# Altium integrated library EwgMicrochips.IntLib: 118 symbols (part 1 of 2) (continued)
## LPC2129 (continued)
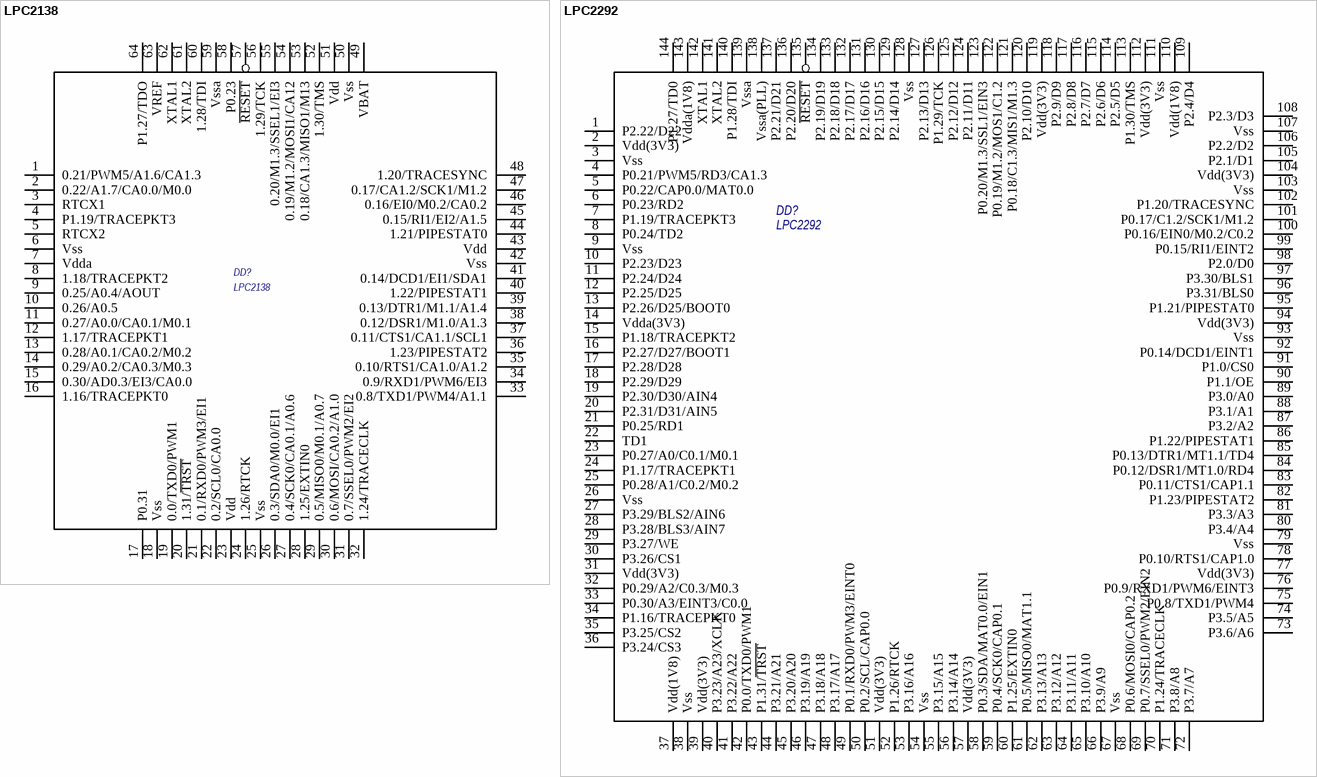
[diagram p3: symbols LPC2138 to LPC2292]

## LPC2138
designator DD?
Микроконтроллер; Примечание: NXP; Тип корпуса: LQFP64; Тип монтажа: Поверхностный; Value: *; Наименование: LPC2138; Тип компонента: Микроконтроллер
footprint LQFP64
pins: 1 0.21/PWM5/A1.6/CA1.3, 2 0.22/A1.7/CA0.0/M0.0, 3 RTCX1, 4 P1.19/TRACEPKT3, 5 RTCX2, 6 Vss, 7 Vdda, 8 1.18/TRACEPKT2, 9 0.25/A0.4/AOUT, 10 0.26/A0.5, 11 0.27/A0.0/CA0.1/M0.1, 12 1.17/TRACEPKT1, 13 0.28/A0.1/CA0.2/M0.2, 14 0.29/A0.2/CA0.3/M0.3, 15 0.30/AD0.3/EI3/CA0.0, 16 1.16/TRACEPKT0, 17 P0.31, 18 Vss, 19 0.0/TXD0/PWM1, 20 1.31/~{TRST}, 21 0.1/RXD0/PWM3/EI1, 22 0.2/SCL0/CA0.0, 23 Vdd, 24 1.26/RTCK, 25 Vss, 26 0.3/SDA0/M0.0/EI1, 27 0.4/SCK0/CA0.1/A0.6, 28 1.25/EXTIN0, 29 0.5/MISO0/M0.1/A0.7, 30 0.6/MOSI/CA0.2/A1.0, 31 0.7/SSEL0/PWM2/EI2, 32 1.24/TRACECLK, 33 0.8/TXD1/PWM4/A1.1, 34 0.9/RXD1/PWM6/EI3, 35 0.10/RTS1/CA1.0/A1.2, 36 1.23/PIPESTAT2, 37 0.11/CTS1/CA1.1/SCL1, 38 0.12/DSR1/M1.0/A1.3, 39 0.13/DTR1/M1.1/A1.4, 40 1.22/PIPESTAT1, 41 0.14/DCD1/EI1/SDA1, 42 Vss, 43 Vdd, 44 1.21/PIPESTAT0, 45 0.15/RI1/EI2/A1.5, 46 0.16/EI0/M0.2/CA0.2, 47 0.17/CA1.2/SCK1/M1.2, 48 1.20/TRACESYNC, 49 VBAT, 50 Vss, 51 Vdd, 52 1.30/TMS, 53 0.18/CA1.3/MISO1/M13, 54 0.19/M1.2/MOSI1/CA12, 55 0.20/M1.3/SSEL1/EI3, 56 1.29/TCK, 57 ~{RESET}, 58 P0.23, 59 Vssa, 60 1.28/TDI, 61 XTAL2, 62 XTAL1, 63 VREF, 64 P1.27/TDO

## LPC2292
designator DD?
Микроконтроллер; Наименование: NXP, LPC2292FBD144; Тип корпуса: LQFP144; Тип монтажа: Поверхностный; Value: *; Тип компонента: Микроконтроллер
footprint LQFP144
pins: 1 P2.22/D22, 2 Vdd(3V3), 3 Vss, 4 P0.21/PWM5/RD3/CA1.3, 5 P0.22/CAP0.0/MAT0.0, 6 P0.23/RD2, 7 P1.19/TRACEPKT3, 8 P0.24/TD2, 9 Vss, 10 P2.23/D23, 11 P2.24/D24, 12 P2.25/D25, 13 P2.26/D25/BOOT0, 14 Vdda(3V3), 15 P1.18/TRACEPKT2, 16 P2.27/D27/BOOT1, 17 P2.28/D28, 18 P2.29/D29, 19 P2.30/D30/AIN4, 20 P2.31/D31/AIN5, 21 P0.25/RD1, 22 TD1, 23 P0.27/A0/C0.1/M0.1, 24 P1.17/TRACEPKT1, 25 P0.28/A1/C0.2/M0.2, 26 Vss, 27 P3.29/BLS2/AIN6, 28 P3.28/BLS3/AIN7, 29 P3.27/WE, 30 P3.26/CS1, 31 Vdd(3V3), 32 P0.29/A2/C0.3/M0.3, 33 P0.30/A3/EINT3/C0.0, 34 P1.16/TRACEPKT0, 35 P3.25/CS2, 36 P3.24/CS3, 37 Vdd(1V8), 38 Vss, 39 Vdd(3V3), 40 P3.23/A23/XCLK, 41 P3.22/A22, 42 P0.0/TXD0/PWM1, 43 P1.31/~{TRST}, 44 P3.21/A21, 45 P3.20/A20, 46 P3.19/A19, 47 P3.18/A18, 48 P3.17/A17, 49 P0.1/RXD0/PWM3/EINT0, 50 P0.2/SCL/CAP0.0, 51 Vdd(3V3), 52 P1.26/RTCK, 53 P3.16/A16, 54 Vss, 55 P3.15/A15, 56 P3.14/A14, 57 Vdd(3V3), 58 P0.3/SDA/MAT0.0/EIN1, 59 P0.4/SCK0/CAP0.1, 60 P1.25/EXTIN0, 61 P0.5/MISO0/MAT1.1, 62 P3.13/A13, 63 P3.12/A12, 64 P3.11/A11, 65 P3.10/A10, 66 P3.9/A9, 67 Vss, 68 P0.6/MOSI0/CAP0.2, 69 P0.7/SSEL0/PWM2/EIN2, 70 P1.24/TRACECLK, 71 P3.8/A8, 72 P3.7/A7, 73 P3.6/A6, 74 P3.5/A5, 75 P0.8/TXD1/PWM4, 76 P0.9/RXD1/PWM6/EINT3, 77 Vdd(3V3), 78 P0.10/RTS1/CAP1.0, 79 Vss, 80 P3.4/A4, 81 P3.3/A3, 82 P1.23/PIPESTAT2, 83 P0.11/CTS1/CAP1.1, 84 P0.12/DSR1/MT1.0/RD4, 85 P0.13/DTR1/MT1.1/TD4, 86 P1.22/PIPESTAT1, 87 P3.2/A2, 88 P3.1/A1, 89 P3.0/A0, 90 P1.1/OE, 91 P1.0/CS0, 92 P0.14/DCD1/EINT1, 93 Vss, 94 Vdd(3V3), 95 P1.21/PIPESTAT0, 96 P3.31/BLS0, 97 P3.30/BLS1, 98 P2.0/D0, 99 P0.15/RI1/EINT2, 100 P0.16/EIN0/M0.2/C0.2, 101 P0.17/C1.2/SCK1/M1.2, 102 P1.20/TRACESYNC, 103 Vss, 104 Vdd(3V3), 105 P2.1/D1, 106 P2.2/D2, 107 Vss, 108 P2.3/D3, 109 P2.4/D4, 110 Vdd(1V8), 111 Vss, 112 Vdd(3V3), 113 P1.30/TMS, 114 P2.5/D5, 115 P2.6/D6, 116 P2.7/D7, 117 P2.8/D8, 118 P2.9/D9, 119 Vdd(3V3), 120 P2.10/D10, 121 P0.18/C1.3/MIS1/M1.3, 122 P0.19/M1.2/MOS1/C1.2, 123 P0.20/M1.3/SSL1/EIN3, 124 P2.11/D11, 125 P2.12/D12, 126 P1.29/TCK, 127 P2.13/D13, 128 Vss, 129 P2.14/D14, 130 P2.15/D15, 131 P2.16/D16, 132 P2.17/D17, 133 P2.18/D18, 134 P2.19/D19, 135 ~{RESET}, 136 P2.20/D20, 137 P2.21/D21, 138 Vssa(PLL), 139 Vssa, 140 P1.28/TDI, 141 XTAL2, 142 XTAL1, 143 Vdda(1V8), 144 P1.27/TD0

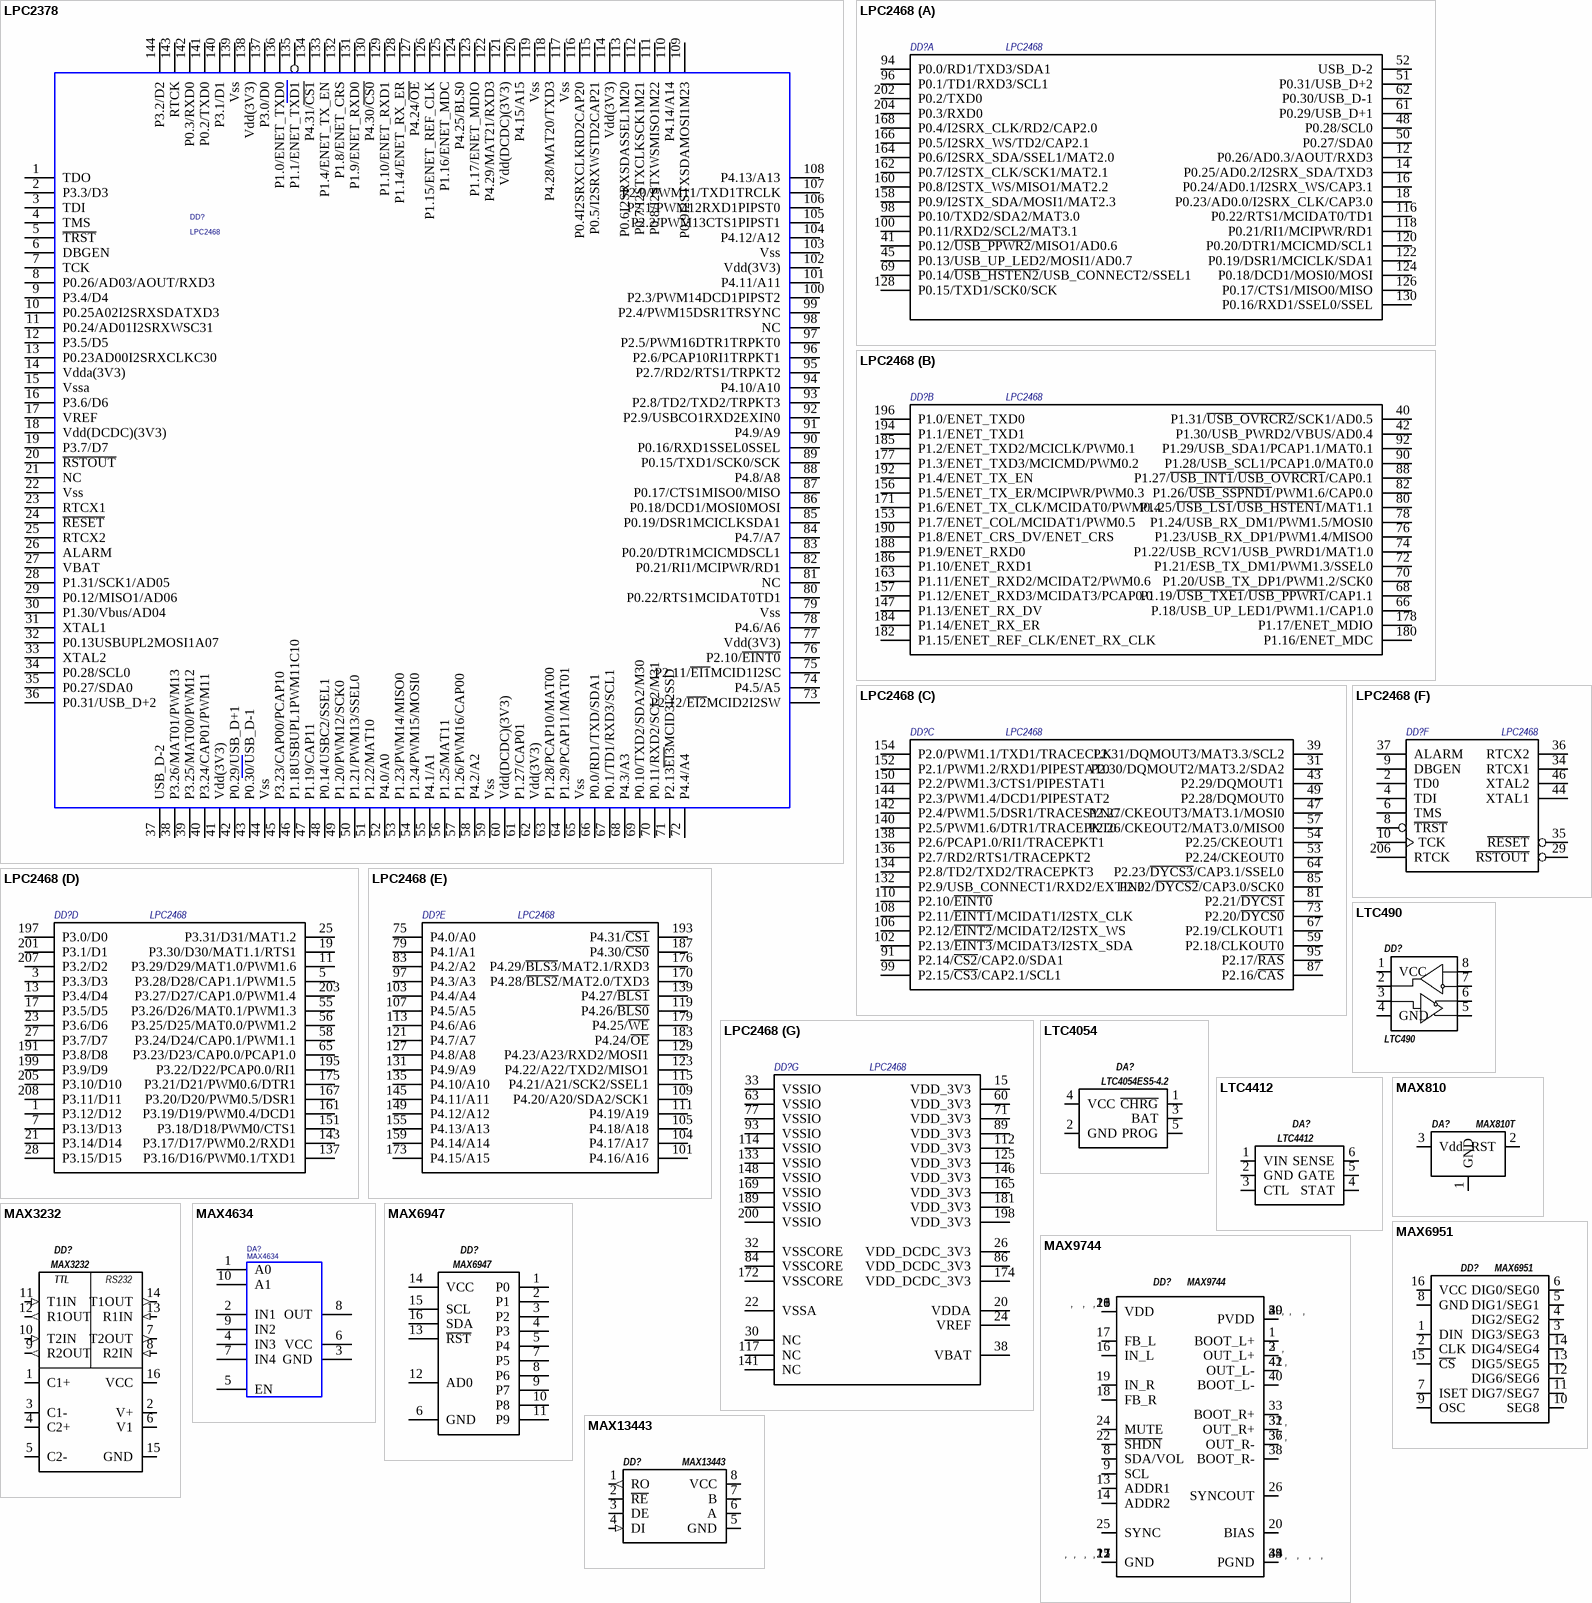
[diagram p4: symbols LPC2378 to MAX13443]

## LPC2378
designator DD?, comment LPC2468
Микроконтроллер; Наименование: NXP, LPC2378FBD144; Тип корпуса: LQFP144; Тип монтажа: Поверхностный; Value: *; Тип компонента: Микроконтроллер
footprint LQFP144
pins: 1 TDO, 2 P3.3/D3, 3 TDI, 4 TMS, 5 ~{TRST}, 6 DBGEN, 7 TCK, 8 P0.26/AD03/AOUT/RXD3, 9 P3.4/D4, 10 P0.25A02I2SRXSDATXD3, 11 P0.24/AD01I2SRXWSC31, 12 P3.5/D5, 13 P0.23AD00I2SRXCLKC30, 14 Vdda(3V3), 15 Vssa, 16 P3.6/D6, 17 VREF, 18 Vdd(DCDC)(3V3), 19 P3.7/D7, 20 ~{RSTOUT}, 21 NC, 22 Vss, 23 RTCX1, 24 ~{RESET}, 25 RTCX2, 26 ALARM, 27 VBAT, 28 P1.31/SCK1/AD05, 29 P0.12/MISO1/AD06, 30 P1.30/Vbus/AD04, 31 XTAL1, 32 P0.13USBUPL2MOSI1A07, 33 XTAL2, 34 P0.28/SCL0, 35 P0.27/SDA0, 36 P0.31/USB_D+2, 37 USB_D-2, 38 P3.26/MAT01/PWM13, 39 P3.25/MAT00/PWM12, 40 P3.24/CAP01/PWM11, 41 Vdd(3V3), 42 P0.29/USB_D+1, 43 P0.30/USB_D-1, 44 Vss, 45 P3.23/CAP00/PCAP10, 46 P1.18USBUPL1PWM11C10, 47 P1.19/CAP11, 48 P0.14/USBC2/SSEL1, 49 P1.20/PWM12/SCK0, 50 P1.21/PWM13/SSEL0, 51 P1.22/MAT10, 52 P4.0/A0, 53 P1.23/PWM14/MISO0, 54 P1.24/PWM15/MOSI0, 55 P4.1/A1, 56 P1.25/MAT11, 57 P1.26/PWM16/CAP00, 58 P4.2/A2, 59 Vss, 60 Vdd(DCDC)(3V3), 61 P1.27/CAP01, 62 Vdd(3V3), 63 P1.28/PCAP10/MAT00, 64 P1.29/PCAP11/MAT01, 65 Vss, 66 P0.0/RD1/TXD/SDA1, 67 P0.1/TD1/RXD3/SCL1, 68 P4.3/A3, 69 P0.10/TXD2/SDA2/M30, 70 P0.11/RXD2/SCL2/M31, 71 P2.13~{EI3}MCID3I2SSD, 72 P4.4/A4, 73 P2.12/~{EI2}MCID2I2SW, 74 P4.5/A5, 75 P2.11/~{EI1}MCID1I2SC, 76 P2.10/~{EINT0}, 77 Vdd(3V3), 78 P4.6/A6, 79 Vss, 80 P0.22/RTS1MCIDAT0TD1, 81 NC, 82 P0.21/RI1/MCIPWR/RD1, 83 P0.20/DTR1MCICMDSCL1, 84 P4.7/A7, 85 P0.19/DSR1MCICLKSDA1, 86 P0.18/DCD1/MOSI0MOSI, 87 P0.17/CTS1MISO0/MISO, 88 P4.8/A8, 89 P0.15/TXD1/SCK0/SCK, 90 P0.16/RXD1SSEL0SSEL, 91 P4.9/A9, 92 P2.9/USBCO1RXD2EXIN0, 93 P2.8/TD2/TXD2/TRPKT3, 94 P4.10/A10, 95 P2.7/RD2/RTS1/TRPKT2, 96 P2.6/PCAP10RI1TRPKT1, 97 P2.5/PWM16DTR1TRPKT0, 98 NC, 99 P2.4/PWM15DSR1TRSYNC, 100 P2.3/PWM14DCD1PIPST2, 101 P4.11/A11, 102 Vdd(3V3), 103 Vss, 104 P4.12/A12, 105 P2.2/PWM13CTS1PIPST1, 106 P2.1/PWM12RXD1PIPST0, 107 P2.0/PWM11/TXD1TRCLK, 108 P4.13/A13, 109 P0.9I2STXSDAMOSI1M23, 110 P4.14/A14, 111 P0.8/I2STXWSMISO1M22, 112 P0.7/I2STXCLKSCK1M21, 113 P0.6I2SRXSDASSEL1M20, 114 Vdd(3V3), 115 P0.5/I2SRXWSTD2CAP21, 116 P0.4I2SRXCLKRD2CAP20, 117 Vss, 118 P4.28/MAT20/TXD3, 119 Vss, 120 P4.15/A15, 121 Vdd(DCDC)(3V3), 122 P4.29/MAT21/RXD3, 123 P1.17/ENET_MDIO, 124 P4.25/BLS0, 125 P1.16/ENET_MDC, 126 P1.15/ENET_REF_CLK, 127 P4.24/~{OE}, 128 P1.14/ENET_RX_ER, 129 P1.10/ENET_RXD1, 130 P4.30/~{CS0}, 131 P1.9/ENET_RXD0, 132 P1.8/ENET_CRS, 133 P1.4/ENET_TX_EN, 134 P4.31/~{CS1}, 135 P1.1/ENET_TXD1, 136 P1.0/ENET_TXD0, 137 P3.0/D0, 138 Vdd(3V3), 139 Vss, 140 P3.1/D1, 141 P0.2/TXD0, 142 P0.3/RXD0, 143 RTCK, 144 P3.2/D2

## LPC2468
designator DD?
Микроконтроллер; Наименование: NXP, LPC2468FBD208; Тип корпуса: LQFP208; Тип монтажа: Поверхностный; Value: LPC2468; Тип компонента: Микроконтроллер
footprint LQFP208
part A pins: 12 P0.26/AD0.3/AOUT/RXD3, 14 P0.25/AD0.2/I2SRX_SDA/TXD3, 16 P0.24/AD0.1/I2SRX_WS/CAP3.1, 18 P0.23/AD0.0/I2SRX_CLK/CAP3.0, 41 P0.12/~{USB_PPWR2}/MISO1/AD0.6, 45 P0.13/USB_UP_LED2/MOSI1/AD0.7, 48 P0.28/SCL0, 50 P0.27/SDA0, 51 P0.31/USB_D+2, 52 USB_D-2, 61 P0.29/USB_D+1, 62 P0.30/USB_D-1, 69 P0.14/~{USB_HSTEN2}/USB_CONNECT2/SSEL1, 94 P0.0/RD1/TXD3/SDA1, 96 P0.1/TD1/RXD3/SCL1, 98 P0.10/TXD2/SDA2/MAT3.0, 100 P0.11/RXD2/SCL2/MAT3.1, 116 P0.22/RTS1/MCIDAT0/TD1, 118 P0.21/RI1/MCIPWR/RD1, 120 P0.20/DTR1/MCICMD/SCL1, 122 P0.19/DSR1/MCICLK/SDA1, 124 P0.18/DCD1/MOSI0/MOSI, 126 P0.17/CTS1/MISO0/MISO, 128 P0.15/TXD1/SCK0/SCK, 130 P0.16/RXD1/SSEL0/SSEL, 158 P0.9/I2STX_SDA/MOSI1/MAT2.3, 160 P0.8/I2STX_WS/MISO1/MAT2.2, 162 P0.7/I2STX_CLK/SCK1/MAT2.1, 164 P0.6/I2SRX_SDA/SSEL1/MAT2.0, 166 P0.5/I2SRX_WS/TD2/CAP2.1, 168 P0.4/I2SRX_CLK/RD2/CAP2.0, 202 P0.2/TXD0, 204 P0.3/RXD0
part B pins: 40 P1.31/~{USB_OVRCR2}/SCK1/AD0.5, 42 P1.30/USB_PWRD2/VBUS/AD0.4, 66 P.18/USB_UP_LED1/PWM1.1/CAP1.0, 68 P1.19/~{USB_TXE1}/~{USB_PPWR1}/CAP1.1, 70 P1.20/USB_TX_DP1/PWM1.2/SCK0, 72 P1.21/ESB_TX_DM1/PWM1.3/SSEL0, 74 P1.22/USB_RCV1/USB_PWRD1/MAT1.0, 76 P1.23/USB_RX_DP1/PWM1.4/MISO0, 78 P1.24/USB_RX_DM1/PWM1.5/MOSI0, 80 P1.25/~{USB_LS1}/~{USB_HSTEN1}/MAT1.1, 82 P1.26/~{USB_SSPND1}/PWM1.6/CAP0.0, 88 P1.27/~{USB_INT1}/~{USB_OVRCR1}/CAP0.1, 90 P1.28/USB_SCL1/PCAP1.0/MAT0.0, 92 P1.29/USB_SDA1/PCAP1.1/MAT0.1, 147 P1.13/ENET_RX_DV, 153 P1.7/ENET_COL/MCIDAT1/PWM0.5, 156 P1.5/ENET_TX_ER/MCIPWR/PWM0.3, 157 P1.12/ENET_RXD3/MCIDAT3/PCAP0.0, 163 P1.11/ENET_RXD2/MCIDAT2/PWM0.6, 171 P1.6/ENET_TX_CLK/MCIDAT0/PWM0.4, 177 P1.3/ENET_TXD3/MCICMD/PWM0.2, 178 P1.17/ENET_MDIO, 180 P1.16/ENET_MDC, 182 P1.15/ENET_REF_CLK/ENET_RX_CLK, 184 P1.14/ENET_RX_ER, 185 P1.2/ENET_TXD2/MCICLK/PWM0.1, 186 P1.10/ENET_RXD1, 188 P1.9/ENET_RXD0, 190 P1.8/ENET_CRS_DV/ENET_CRS, 192 P1.4/ENET_TX_EN, 194 P1.1/ENET_TXD1, 196 P1.0/ENET_TXD0
part C pins: 31 P2.30/DQMOUT2/MAT3.2/SDA2, 39 P2.31/DQMOUT3/MAT3.3/SCL2, 43 P2.29/DQMOUT1, 47 P2.27/CKEOUT3/MAT3.1/MOSI0, 49 P2.28/DQMOUT0, 53 P2.24/CKEOUT0, 54 P2.25/CKEOUT1, 57 P2.26/CKEOUT2/MAT3.0/MISO0, 59 P2.18/CLKOUT0, 64 P2.23/~{DYCS3}/CAP3.1/SSEL0, 67 P2.19/CLKOUT1, 73 P2.20/~{DYCS0}, 81 P2.21/~{DYCS1}, 85 P2.22/~{DYCS2}/CAP3.0/SCK0, 87 P2.16/~{CAS}, 91 P2.14/~{CS2}/CAP2.0/SDA1, 95 P2.17/~{RAS}, 99 P2.15/~{CS3}/CAP2.1/SCL1, 102 P2.13/~{EINT3}/MCIDAT3/I2STX_SDA, 106 P2.12/~{EINT2}/MCIDAT2/I2STX_WS, 108 P2.11/~{EINT1}/MCIDAT1/I2STX_CLK, 110 P2.10/~{EINT0}, 132 P2.9/USB_CONNECT1/RXD2/EXTIN0, 134 P2.8/TD2/TXD2/TRACEPKT3, 136 P2.7/RD2/RTS1/TRACEPKT2, 138 P2.6/PCAP1.0/RI1/TRACEPKT1, 140 P2.5/PWM1.6/DTR1/TRACEPKT0, 142 P2.4/PWM1.5/DSR1/TRACESYNC, 144 P2.3/PWM1.4/DCD1/PIPESTAT2, 150 P2.2/PWM1.3/CTS1/PIPESTAT1, 152 P2.1/PWM1.2/RXD1/PIPESTAT0, 154 P2.0/PWM1.1/TXD1/TRACECLK
part D pins: 1 P3.12/D12, 3 P3.3/D3, 5 P3.28/D28/CAP1.1/PWM1.5, 7 P3.13/D13, 11 P3.29/D29/MAT1.0/PWM1.6, 13 P3.4/D4, 17 P3.5/D5, 19 P3.30/D30/MAT1.1/RTS1, 21 P3.14/D14, 23 P3.6/D6, 25 P3.31/D31/MAT1.2, 27 P3.7/D7, 28 P3.15/D15, 55 P3.26/D26/MAT0.1/PWM1.3, 56 P3.25/D25/MAT0.0/PWM1.2, 58 P3.24/D24/CAP0.1/PWM1.1, 65 P3.23/D23/CAP0.0/PCAP1.0, 137 P3.16/D16/PWM0.1/TXD1, 143 P3.17/D17/PWM0.2/RXD1, 151 P3.18/D18/PWM0/CTS1, 161 P3.19/D19/PWM0.4/DCD1, 167 P3.20/D20/PWM0.5/DSR1, 175 P3.21/D21/PWM0.6/DTR1, 191 P3.8/D8, 195 P3.22/D22/PCAP0.0/RI1, 197 P3.0/D0, 199 P3.9/D9, 201 P3.1/D1, 203 P3.27/D27/CAP1.0/PWM1.4, 205 P3.10/D10, 207 P3.2/D2, 208 P3.11/D11
part E pins: 75 P4.0/A0, 79 P4.1/A1, 83 P4.2/A2, 97 P4.3/A3, 101 P4.16/A16, 103 P4.4/A4, 104 P4.17/A17, 105 P4.18/A18, 107 P4.5/A5, 109 P4.20/A20/SDA2/SCK1, 111 P4.19/A19, 113 P4.6/A6, 115 P4.21/A21/SCK2/SSEL1, 119 P4.26/~{BLS0}, 121 P4.7/A7, 123 P4.22/A22/TXD2/MISO1, 127 P4.8/A8, 129 P4.23/A23/RXD2/MOSI1, 131 P4.9/A9, 135 P4.10/A10, 139 P4.27/~{BLS1}, 145 P4.11/A11, 149 P4.12/A12, 155 P4.13/A13, 159 P4.14/A14, 170 P4.28/~{BLS2}/MAT2.0/TXD3, 173 P4.15/A15, 176 P4.29/~{BLS3}/MAT2.1/RXD3, 179 P4.25/~{WE}, 183 P4.24/~{OE}, 187 P4.30/~{CS0}, 193 P4.31/~{CS1}
part F pins: 2 TD0, 4 TDI, 6 TMS, 8 ~{TRST}, 9 DBGEN, 10 TCK, 29 ~{RSTOUT}, 34 RTCX1, 35 ~{RESET}, 36 RTCX2, 37 ALARM, 44 XTAL1, 46 XTAL2, 206 RTCK
part G pins: 15 VDD_3V3, 20 VDDA, 22 VSSA, 24 VREF, 26 VDD_DCDC_3V3, 30 NC, 32 VSSCORE, 33 VSSIO, 38 VBAT, 60 VDD_3V3, 63 VSSIO, 71 VDD_3V3, 77 VSSIO, 84 VSSCORE, 86 VDD_DCDC_3V3, 89 VDD_3V3, 93 VSSIO, 112 VDD_3V3, 114 VSSIO, 117 NC, 125 VDD_3V3, 133 VSSIO, 141 NC, 146 VDD_3V3, 148 VSSIO, 165 VDD_3V3, 169 VSSIO, 172 VSSCORE, 174 VDD_DCDC_3V3, 181 VDD_3V3, 189 VSSIO, 198 VDD_3V3, 200 VSSIO

## LTC490
designator DD?
Интерфейс RS422/RS485; Производитель: Linear Technology; Тип корпуса: SO8; Тип монтажа: Поверхностный; Наименование: LTC490; Тип компонента: Интерфейс RS422/RS485
footprint SO8
pins: 1 VCC, 2 R, 3 D, 4 GND, 5 Y, 6 Z, 7 B, 8 A

## LTC4054
designator DA?, comment LTC4054ES5-4.2
Контроллер заряда Li-ion АКБ; Производитель: Linear Technology; Тип корпуса: SOT-23-5; Тип монтажа: Поверхностный; Характеристики: Вх. 4.5-6.5В, вых. 4.2В 600мА; Наименование: LTC4054ES5-4.2; Тип компонента: Контроллер заряда Li-ion АКБ; Value: *
footprint SOT23-5
pins: 1 ~{CHRG}, 2 GND, 3 BAT, 4 VCC, 5 PROG

## LTC4412
designator DA?
Контроллер питания; Производитель: Linear Technology; Тип корпуса: SOT23-6; Тип монтажа: Поверхностный; Характеристики: Вх. 2.5-28В; Наименование: LTC4412; Тип компонента: Контроллер питания
footprint SOT23-6
pins: 1 VIN, 2 GND, 3 CTL, 4 STAT, 5 GATE, 6 SENSE

## MAX810
designator DA?, comment MAX810T
Монитор питания; Производитель: ON Semiconductor; Тип корпуса: SOT-23; Тип монтажа: Поверхностный; Характеристики: Порог 2.93В; Value: *; Наименование: MAX810T; Тип компонента: Монитор питания
footprint SOT23-3
pins: 1 GND, 2 RST, 3 Vdd

## MAX3232
designator DD?
Интерфейс RS232 2 кан.; Производитель: Maxim Semiconductor; Тип корпуса: SO16; Тип монтажа: Поверхностный; Характеристики: 120кБит/с; Наименование: MAX3232; Тип компонента: Интерфейс RS232 2 кан.
footprint SO16-3.9
pins: 1 C1+, 2 V+, 3 C1-, 4 C2+, 5 C2-, 6 V1, 7 T2OUT (out), 8 R2IN (in), 9 R2OUT (out), 10 T2IN (in), 11 T1IN (in), 12 R1OUT (out), 13 R1IN (in), 14 T1OUT (out), 15 GND, 16 VCC
1 alternate drawing of the same symbol
text: TTL; RS232

## MAX4634
designator DA?
Микросхема - Мультиплексор; Наименование: Maxim Semiconductor, MAX4634EUB+; Тип корпуса: USOP; Тип монтажа: Поверхностный; Value: *; Тип компонента: Микросхема - Мультиплексор
footprint USOP
pins: 1 A0, 2 IN1, 3 GND, 4 IN3, 5 EN, 6 VCC, 7 IN4, 8 OUT, 9 IN2, 10 A1

## MAX6947
designator DD?
Контроллер LED; Производитель: MAXIM; Тип корпуса: TQFN16; Тип монтажа: Поверхностный; Характеристики: 10 LEDs; Наименование: MAX6947; Тип компонента: Контроллер LED
footprint QFN16-0.5
pins: 1 P0, 2 P1, 3 P2, 4 P3, 5 P4, 6 GND, 7 P5, 8 P6, 9 P7, 10 P8, 11 P9, 12 AD0, 13 ~{RST}, 14 VCC, 15 SCL, 16 SDA

## MAX6951
designator DD?
Контроллер LED матрицы; Производитель: Maxim; Тип корпуса: SO16; Тип монтажа: Поверхностный; Характеристики: Размеры матрицы до 8х8; Наименование: MAX6951; Тип компонента: Контроллер LED матрицы
footprint TSSOP16_P
pins: 1 DIN, 2 CLK, 3 DIG3/SEG3, 4 DIG2/SEG2, 5 DIG1/SEG1, 6 DIG0/SEG0, 7 ISET, 8 GND, 9 OSC, 10 SEG8, 11 DIG7/SEG7, 12 DIG6/SEG6, 13 DIG5/SEG5, 14 DIG4/SEG4, 15 ~{CS}, 16 VCC
